# Altium footprint library 排针排座.PcbLib: 344 footprints (part 3 of 22)
Each footprint in its own frame and in the unit in brackets; x right, y up, seen from the top. Pads: shape width x height; smd on the part's side, far side on the other; paste and mask are expansions set on the pad; w line width, h text height; cw(c..) or ccw(c..) is an arc to the next point about the centre after c.
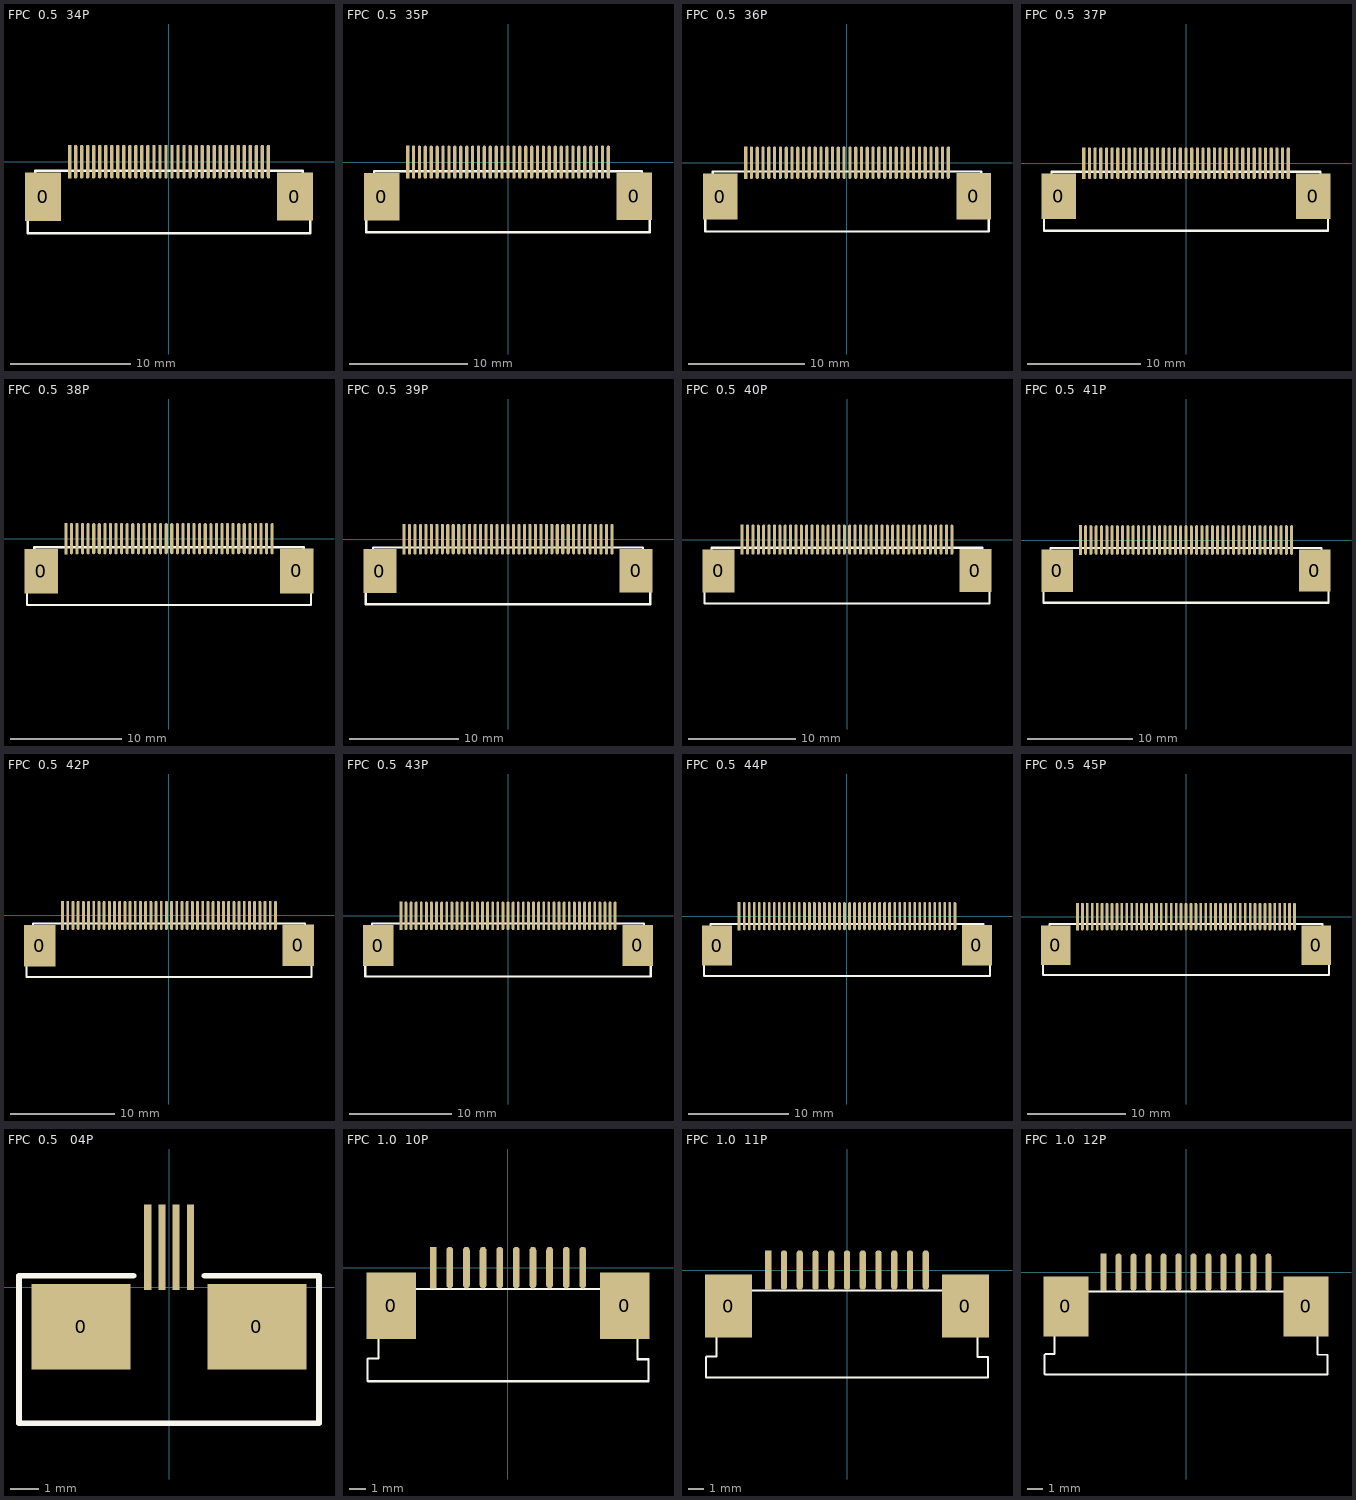
[diagram p2: the footprints below, top view; thin cyan lines are the x and y axes]

## FPC  0.5  34P [mm]
height 2
pads (36):
  rect 3x4 smd: 0(-10.446,-2.921) 0(10.454,-2.896)
  rect 0.28x2.8 smd: 1(-8.246,0)
  oval 0.28x2.8 smd: 2(-7.746,0) 3(-7.246,0) 4(-6.746,0) 5(-6.246,0) 6(-5.746,0) 7(-5.246,0) 8(-4.746,0) 9(-4.246,0) 10(-3.746,0) 11(-3.246,0) 12(-2.746,0) 13(-2.246,0) 14(-1.746,0) 15(-1.246,0) 16(-0.746,0) 17(-0.246,0) 18(0.254,0) 19(0.754,0) 20(1.254,0) 21(1.754,0) 22(2.254,0) 23(2.754,0) 24(3.254,0) 25(3.754,0) 26(4.254,0) 27(4.754,0) 28(5.254,0) 29(5.754,0) 30(6.254,0) 31(6.754,0) 32(7.254,0) 33(7.754,0) 34(8.254,0)
Top Overlay:
  lines w0.203: -11.738,-5.944 11.746,-5.944 11.746,-4.624 11.148,-4.624 11.096,-4.572 11.096,-0.762 -11.088,-0.762 -11.088,-4.572 -11.14,-4.624 -11.738,-4.624 -11.738,-5.944
3D body "FPC  0.5  34P.step": height 2, standoff 0, extent -11.65,-6 11.65,0

## FPC  0.5  35P [mm]
height 2
pads (37):
  rect 3x4 smd: 0(-10.7,-2.921) 0(10.7,-2.896)
  rect 0.28x2.8 smd: 1(-8.5,0)
  oval 0.28x2.8 smd: 2(-8,0) 3(-7.5,0) 4(-7,0) 5(-6.5,0) 6(-6,0) 7(-5.5,0) 8(-5,0) 9(-4.5,0) 10(-4,0) 11(-3.5,0) 12(-3,0) 13(-2.5,0) 14(-2,0) 15(-1.5,0) 16(-1,0) 17(-0.5,0) 18(0,0) 19(0.5,0) 20(1,0) 21(1.5,0) 22(2,0) 23(2.5,0) 24(3,0) 25(3.5,0) 26(4,0) 27(4.5,0) 28(5,0) 29(5.5,0) 30(6,0) 31(6.5,0) 32(7,0) 33(7.5,0) 34(8,0) 35(8.5,0)
Top Overlay:
  lines w0.203: -11.992,-5.944 11.992,-5.944 11.992,-4.624 11.394,-4.624 11.342,-4.572 11.342,-0.762 -11.342,-0.762 -11.342,-4.572 -11.394,-4.624 -11.992,-4.624 -11.992,-5.944
3D body "FPC  0.5  35P.step": height 2, standoff 0, extent -11.9,-6 11.9,0

## FPC  0.5  36P [mm]
height 2
pads (38):
  rect 3x4 smd: 0(-10.939,-2.921) 0(10.961,-2.896)
  rect 0.28x2.8 smd: 1(-8.739,0)
  oval 0.28x2.8 smd: 2(-8.239,0) 3(-7.739,0) 4(-7.239,0) 5(-6.739,0) 6(-6.239,0) 7(-5.739,0) 8(-5.239,0) 9(-4.739,0) 10(-4.239,0) 11(-3.739,0) 12(-3.239,0) 13(-2.739,0) 14(-2.239,0) 15(-1.739,0) 16(-1.239,0) 17(-0.739,0) 18(-0.239,0) 19(0.261,0) 20(0.761,0) 21(1.261,0) 22(1.761,0) 23(2.261,0) 24(2.761,0) 25(3.261,0) 26(3.761,0) 27(4.261,0) 28(4.761,0) 29(5.261,0) 30(5.761,0) 31(6.261,0) 32(6.761,0) 33(7.261,0) 34(7.761,0) 35(8.261,0) 36(8.761,0)
Top Overlay:
  lines w0.203: -12.231,-5.944 12.252,-5.944 12.252,-4.624 11.654,-4.624 11.602,-4.572 11.602,-0.762 -11.581,-0.762 -11.581,-4.572 -11.633,-4.624 -12.231,-4.624 -12.231,-5.944
3D body "FPC  0.5  36P.step": height 2, standoff 0, extent -12.15,-6 12.15,0

## FPC  0.5  37P [mm]
height 2
pads (39):
  rect 3x4 smd: 0(-11.2,-2.921) 0(11.2,-2.896)
  rect 0.28x2.8 smd: 1(-9,0)
  oval 0.28x2.8 smd: 2(-8.5,0) 3(-8,0) 4(-7.5,0) 5(-7,0) 6(-6.5,0) 7(-6,0) 8(-5.5,0) 9(-5,0) 10(-4.5,0) 11(-4,0) 12(-3.5,0) 13(-3,0) 14(-2.5,0) 15(-2,0) 16(-1.5,0) 17(-1,0) 18(-0.5,0) 19(0,0) 20(0.5,0) 21(1,0) 22(1.5,0) 23(2,0) 24(2.5,0) 25(3,0) 26(3.5,0) 27(4,0) 28(4.5,0) 29(5,0) 30(5.5,0) 31(6,0) 32(6.5,0) 33(7,0) 34(7.5,0) 35(8,0) 36(8.5,0) 37(9,0)
Top Overlay:
  lines w0.203: -12.492,-5.944 12.492,-5.944 12.492,-4.624 11.894,-4.624 11.842,-4.572 11.842,-0.762 -11.842,-0.762 -11.842,-4.572 -11.894,-4.624 -12.492,-4.624 -12.492,-5.944
3D body "FPC  0.5  37P.step": height 2, standoff 0, extent -12.4,-6 12.4,0

## FPC  0.5  38P [mm]
height 2
pads (40):
  rect 3x4 smd: 0(-11.447,-2.921) 0(11.453,-2.896)
  rect 0.28x2.8 smd: 1(-9.247,0)
  oval 0.28x2.8 smd: 2(-8.747,0) 3(-8.247,0) 4(-7.747,0) 5(-7.247,0) 6(-6.747,0) 7(-6.247,0) 8(-5.747,0) 9(-5.247,0) 10(-4.747,0) 11(-4.247,0) 12(-3.747,0) 13(-3.247,0) 14(-2.747,0) 15(-2.247,0) 16(-1.747,0) 17(-1.247,0) 18(-0.747,0) 19(-0.247,0) 20(0.253,0) 21(0.753,0) 22(1.253,0) 23(1.753,0) 24(2.253,0) 25(2.753,0) 26(3.253,0) 27(3.753,0) 28(4.253,0) 29(4.753,0) 30(5.253,0) 31(5.753,0) 32(6.253,0) 33(6.753,0) 34(7.253,0) 35(7.753,0) 36(8.253,0) 37(8.753,0) 38(9.253,0)
Top Overlay:
  lines w0.203: -12.739,-5.944 12.744,-5.944 12.744,-4.624 12.146,-4.624 12.094,-4.572 12.094,-0.762 -12.089,-0.762 -12.089,-4.572 -12.141,-4.624 -12.739,-4.624 -12.739,-5.944
3D body "FPC  0.5  38P.step": height 2, standoff 0, extent -12.65,-6 12.65,0

## FPC  0.5  39P [mm]
height 2
pads (41):
  rect 3x4 smd: 0(-11.7,-2.921) 0(11.7,-2.896)
  rect 0.28x2.8 smd: 1(-9.5,0)
  oval 0.28x2.8 smd: 2(-9,0) 3(-8.5,0) 4(-8,0) 5(-7.5,0) 6(-7,0) 7(-6.5,0) 8(-6,0) 9(-5.5,0) 10(-5,0) 11(-4.5,0) 12(-4,0) 13(-3.5,0) 14(-3,0) 15(-2.5,0) 16(-2,0) 17(-1.5,0) 18(-1,0) 19(-0.5,0) 20(0,0) 21(0.5,0) 22(1,0) 23(1.5,0) 24(2,0) 25(2.5,0) 26(3,0) 27(3.5,0) 28(4,0) 29(4.5,0) 30(5,0) 31(5.5,0) 32(6,0) 33(6.5,0) 34(7,0) 35(7.5,0) 36(8,0) 37(8.5,0) 38(9,0) 39(9.5,0)
Top Overlay:
  lines w0.203: -12.992,-5.944 -12.992,-4.624 -12.394,-4.624 -12.342,-4.572 -12.342,-0.762 12.342,-0.762 12.342,-4.572 12.394,-4.624 12.992,-4.624 12.992,-5.944 -12.992,-5.944
3D body "FPC  0.5  39P.step": height 2, standoff 0, extent -12.9,-6 12.9,0

## FPC  0.5  40P [mm]
height 2
pads (42):
  rect 3x4 smd: 0(-11.955,-2.921) 0(11.945,-2.896)
  rect 0.28x2.8 smd: 1(-9.755,0)
  oval 0.28x2.8 smd: 2(-9.255,0) 3(-8.755,0) 4(-8.255,0) 5(-7.755,0) 6(-7.255,0) 7(-6.755,0) 8(-6.255,0) 9(-5.755,0) 10(-5.255,0) 11(-4.755,0) 12(-4.255,0) 13(-3.755,0) 14(-3.255,0) 15(-2.755,0) 16(-2.255,0) 17(-1.755,0) 18(-1.255,0) 19(-0.755,0) 20(-0.255,0) 21(0.245,0) 22(0.745,0) 23(1.245,0) 24(1.745,0) 25(2.245,0) 26(2.745,0) 27(3.245,0) 28(3.745,0) 29(4.245,0) 30(4.745,0) 31(5.245,0) 32(5.745,0) 33(6.245,0) 34(6.745,0) 35(7.245,0) 36(7.745,0) 37(8.245,0) 38(8.745,0) 39(9.245,0) 40(9.745,0)
Top Overlay:
  lines w0.203: -13.247,-5.944 13.236,-5.944 13.236,-4.624 12.638,-4.624 12.586,-4.572 12.586,-0.762 -12.597,-0.762 -12.597,-4.572 -12.649,-4.624 -13.247,-4.624 -13.247,-5.944
3D body "FPC  0.5  40P.step": height 2, standoff 0, extent -13.15,-6 13.15,0

## FPC  0.5  41P [mm]
height 2
pads (43):
  rect 3x4 smd: 0(-12.2,-2.921) 0(12.2,-2.896)
  rect 0.28x2.8 smd: 1(-10,0)
  oval 0.28x2.8 smd: 2(-9.5,0) 3(-9,0) 4(-8.5,0) 5(-8,0) 6(-7.5,0) 7(-7,0) 8(-6.5,0) 9(-6,0) 10(-5.5,0) 11(-5,0) 12(-4.5,0) 13(-4,0) 14(-3.5,0) 15(-3,0) 16(-2.5,0) 17(-2,0) 18(-1.5,0) 19(-1,0) 20(-0.5,0) 21(0,0) 22(0.5,0) 23(1,0) 24(1.5,0) 25(2,0) 26(2.5,0) 27(3,0) 28(3.5,0) 29(4,0) 30(4.5,0) 31(5,0) 32(5.5,0) 33(6,0) 34(6.5,0) 35(7,0) 36(7.5,0) 37(8,0) 38(8.5,0) 39(9,0) 40(9.5,0) 41(10,0)
Top Overlay:
  lines w0.203: -13.492,-5.944 13.492,-5.944 13.492,-4.624 12.894,-4.624 12.842,-4.572 12.842,-0.762 -12.842,-0.762 -12.842,-4.572 -12.894,-4.624 -13.492,-4.624 -13.492,-5.944
3D body "FPC  0.5  41P.step": height 2, standoff 0, extent -13.4,-6 13.4,0

## FPC  0.5  42P [mm]
height 2
pads (44):
  rect 3x4 smd: 0(-12.438,-2.921) 0(12.462,-2.896)
  rect 0.28x2.8 smd: 1(-10.238,0)
  oval 0.28x2.8 smd: 2(-9.738,0) 3(-9.238,0) 4(-8.738,0) 5(-8.238,0) 6(-7.738,0) 7(-7.238,0) 8(-6.738,0) 9(-6.238,0) 10(-5.738,0) 11(-5.238,0) 12(-4.738,0) 13(-4.238,0) 14(-3.738,0) 15(-3.238,0) 16(-2.738,0) 17(-2.238,0) 18(-1.738,0) 19(-1.238,0) 20(-0.738,0) 21(-0.238,0) 22(0.262,0) 23(0.762,0) 24(1.262,0) 25(1.762,0) 26(2.262,0) 27(2.762,0) 28(3.262,0) 29(3.762,0) 30(4.262,0) 31(4.762,0) 32(5.262,0) 33(5.762,0) 34(6.262,0) 35(6.762,0) 36(7.262,0) 37(7.762,0) 38(8.262,0) 39(8.762,0) 40(9.262,0) 41(9.762,0) 42(10.262,0)
Top Overlay:
  lines w0.203: -13.73,-5.944 -13.73,-4.624 -13.132,-4.624 -13.08,-4.572 -13.08,-0.762 13.104,-0.762 13.104,-4.572 13.156,-4.624 13.754,-4.624 13.754,-5.944 -13.73,-5.944
3D body "FPC  0.5  42P.step": height 2, standoff 0, extent -13.65,-6 13.65,0

## FPC  0.5  43P [mm]
height 2
pads (45):
  rect 3x4 smd: 0(-12.7,-2.921) 0(12.7,-2.896)
  rect 0.28x2.8 smd: 1(-10.5,0)
  oval 0.28x2.8 smd: 2(-10,0) 3(-9.5,0) 4(-9,0) 5(-8.5,0) 6(-8,0) 7(-7.5,0) 8(-7,0) 9(-6.5,0) 10(-6,0) 11(-5.5,0) 12(-5,0) 13(-4.5,0) 14(-4,0) 15(-3.5,0) 16(-3,0) 17(-2.5,0) 18(-2,0) 19(-1.5,0) 20(-1,0) 21(-0.5,0) 22(0,0) 23(0.5,0) 24(1,0) 25(1.5,0) 26(2,0) 27(2.5,0) 28(3,0) 29(3.5,0) 30(4,0) 31(4.5,0) 32(5,0) 33(5.5,0) 34(6,0) 35(6.5,0) 36(7,0) 37(7.5,0) 38(8,0) 39(8.5,0) 40(9,0) 41(9.5,0) 42(10,0) 43(10.5,0)
Top Overlay:
  lines w0.203: -13.992,-5.944 -13.992,-4.624 -13.394,-4.624 -13.342,-4.572 -13.342,-0.762 13.342,-0.762 13.342,-4.572 13.394,-4.624 13.992,-4.624 13.992,-5.944 -13.992,-5.944
3D body "FPC  0.5  43P.step": height 2, standoff 0, extent -13.9,-6 13.9,0

## FPC  0.5  44P [mm]
height 2
pads (46):
  rect 3x4 smd: 0(-12.946,-2.921) 0(12.954,-2.896)
  rect 0.28x2.8 smd: 1(-10.746,0)
  oval 0.28x2.8 smd: 2(-10.246,0) 3(-9.746,0) 4(-9.246,0) 5(-8.746,0) 6(-8.246,0) 7(-7.746,0) 8(-7.246,0) 9(-6.746,0) 10(-6.246,0) 11(-5.746,0) 12(-5.246,0) 13(-4.746,0) 14(-4.246,0) 15(-3.746,0) 16(-3.246,0) 17(-2.746,0) 18(-2.246,0) 19(-1.746,0) 20(-1.246,0) 21(-0.746,0) 22(-0.246,0) 23(0.254,0) 24(0.754,0) 25(1.254,0) 26(1.754,0) 27(2.254,0) 28(2.754,0) 29(3.254,0) 30(3.754,0) 31(4.254,0) 32(4.754,0) 33(5.254,0) 34(5.754,0) 35(6.254,0) 36(6.754,0) 37(7.254,0) 38(7.754,0) 39(8.254,0) 40(8.754,0) 41(9.254,0) 42(9.754,0) 43(10.254,0) 44(10.754,0)
Top Overlay:
  lines w0.203: -14.238,-5.944 14.246,-5.944 14.246,-4.624 13.648,-4.624 13.596,-4.572 13.596,-0.762 -13.588,-0.762 -13.588,-4.572 -13.64,-4.624 -14.238,-4.624 -14.238,-5.944
3D body "FPC  0.5  44P.step": height 2, standoff 0, extent -14.15,-6 14.15,0

## FPC  0.5  45P [mm]
height 2
pads (47):
  rect 3x4 smd: 0(-13.2,-2.921) 0(13.2,-2.896)
  rect 0.28x2.8 smd: 1(-11,0)
  oval 0.28x2.8 smd: 2(-10.5,0) 3(-10,0) 4(-9.5,0) 5(-9,0) 6(-8.5,0) 7(-8,0) 8(-7.5,0) 9(-7,0) 10(-6.5,0) 11(-6,0) 12(-5.5,0) 13(-5,0) 14(-4.5,0) 15(-4,0) 16(-3.5,0) 17(-3,0) 18(-2.5,0) 19(-2,0) 20(-1.5,0) 21(-1,0) 22(-0.5,0) 23(0,0) 24(0.5,0) 25(1,0) 26(1.5,0) 27(2,0) 28(2.5,0) 29(3,0) 30(3.5,0) 31(4,0) 32(4.5,0) 33(5,0) 34(5.5,0) 35(6,0) 36(6.5,0) 37(7,0) 38(7.5,0) 39(8,0) 40(8.5,0) 41(9,0) 42(9.5,0) 43(10,0) 44(10.5,0) 45(11,0)
Top Overlay:
  lines w0.203: -14.492,-5.944 14.492,-5.944 14.492,-4.624 13.894,-4.624 13.842,-4.572 13.842,-0.762 -13.842,-0.762 -13.842,-4.572 -13.894,-4.624 -14.492,-4.624 -14.492,-5.944
3D body "FPC  0.5  45P.step": height 2, standoff 0, extent -14.4,-6 14.4,0

## FPC  0.5   04P [mm] "长：6.2mm，宽：5.2mm，高：2mm"
pads (6):
  rect 3.5x3 smd: 0(-3.099,-1.4) 0(3.099,-1.4)
  rect 0.25x3 smd: 1(-0.75,1.4) 2(-0.25,1.4) 3(0.25,1.4) 4(0.75,1.4)
Top Overlay:
  lines w0.2: -1.25,0.4 -5.283,0.4 -5.283,-4.8 5.283,-4.8 5.283,0.4 1.25,0.4
3D body "FPC0.5 2H-S-W-4P.STEP": height 2, standoff -0.01, extent -3.1,-4.826 3.1,1.174

## FPC  1.0  10P [mm] "10 pins"
height 2
pads (12):
  rect 3x4 smd: 0(-7.003,-2.289) 0(7.037,-2.289)
  rect 0.4x2.5 smd: 1(-4.483,0)
  oval 0.4x2.5 smd: 2(-3.483,0) 3(-2.483,0) 4(-1.483,0) 5(-0.483,0) 6(0.517,0) 7(1.517,0) 8(2.517,0) 9(3.517,0) 10(4.517,0)
Top Overlay:
  lines w0.127: -7.775,-1.295 -7.775,-5.474 -8.384,-5.474 -8.425,-5.515 -8.425,-6.807 -8.4,-6.833 8.46,-6.833 8.46,-5.513 7.81,-5.513 7.81,-1.293 -7.775,-1.293
3D body "FPC  1.0  10P.step": height 2.4, standoff 0, extent -8.4,-6.7 8.4,0

## FPC  1.0  11P [mm] "11 Pins"
height 2
pads (13):
  rect 3x4 smd: 0(-7.52,-2.289) 0(7.52,-2.289)
  rect 0.4x2.5 smd: 1(-5,0)
  oval 0.4x2.5 smd: 2(-4,0) 3(-3,0) 4(-2,0) 5(-1,0) 6(0,0) 7(1,0) 8(2,0) 9(3,0) 10(4,0) 11(5,0)
Top Overlay:
  lines w0.127: -8.293,-1.295 -8.293,-5.474 -8.901,-5.474 -8.943,-5.515 -8.943,-6.807 -8.917,-6.833 8.943,-6.833 8.943,-5.513 8.293,-5.513 8.293,-1.293 -8.293,-1.293
3D body "FPC  1.0  11P.step": height 2.4, standoff 0, extent -8.9,-6.7 8.9,0

## FPC  1.0  12P [mm] "12 Pins"
height 2
pads (14):
  rect 3x4 smd: 0(-8.028,-2.289) 0(8.012,-2.289)
  rect 0.4x2.5 smd: 1(-5.508,0)
  oval 0.4x2.5 smd: 2(-4.508,0) 3(-3.508,0) 4(-2.508,0) 5(-1.508,0) 6(-0.508,0) 7(0.492,0) 8(1.492,0) 9(2.492,0) 10(3.492,0) 11(4.492,0) 12(5.492,0)
Top Overlay:
  lines w0.127: -8.801,-1.295 -8.801,-5.474 -9.409,-5.474 -9.451,-5.515 -9.451,-6.807 -9.425,-6.833 9.435,-6.833 9.435,-5.513 8.785,-5.513 8.785,-1.293 -8.801,-1.293
3D body "FPC  1.0  12P.step": height 2.4, standoff 0, extent -9.4,-6.7 9.4,0